# Altium footprint library Connectors.PcbLib: 122 footprints (part 8 of 8)
Each footprint in its own frame and in the unit in brackets; x right, y up, seen from the top. Pads: shape width x height; smd on the part's side, far side on the other; paste and mask are expansions set on the pad; w line width, h text height; cw(c..) or ccw(c..) is an arc to the next point about the centre after c.
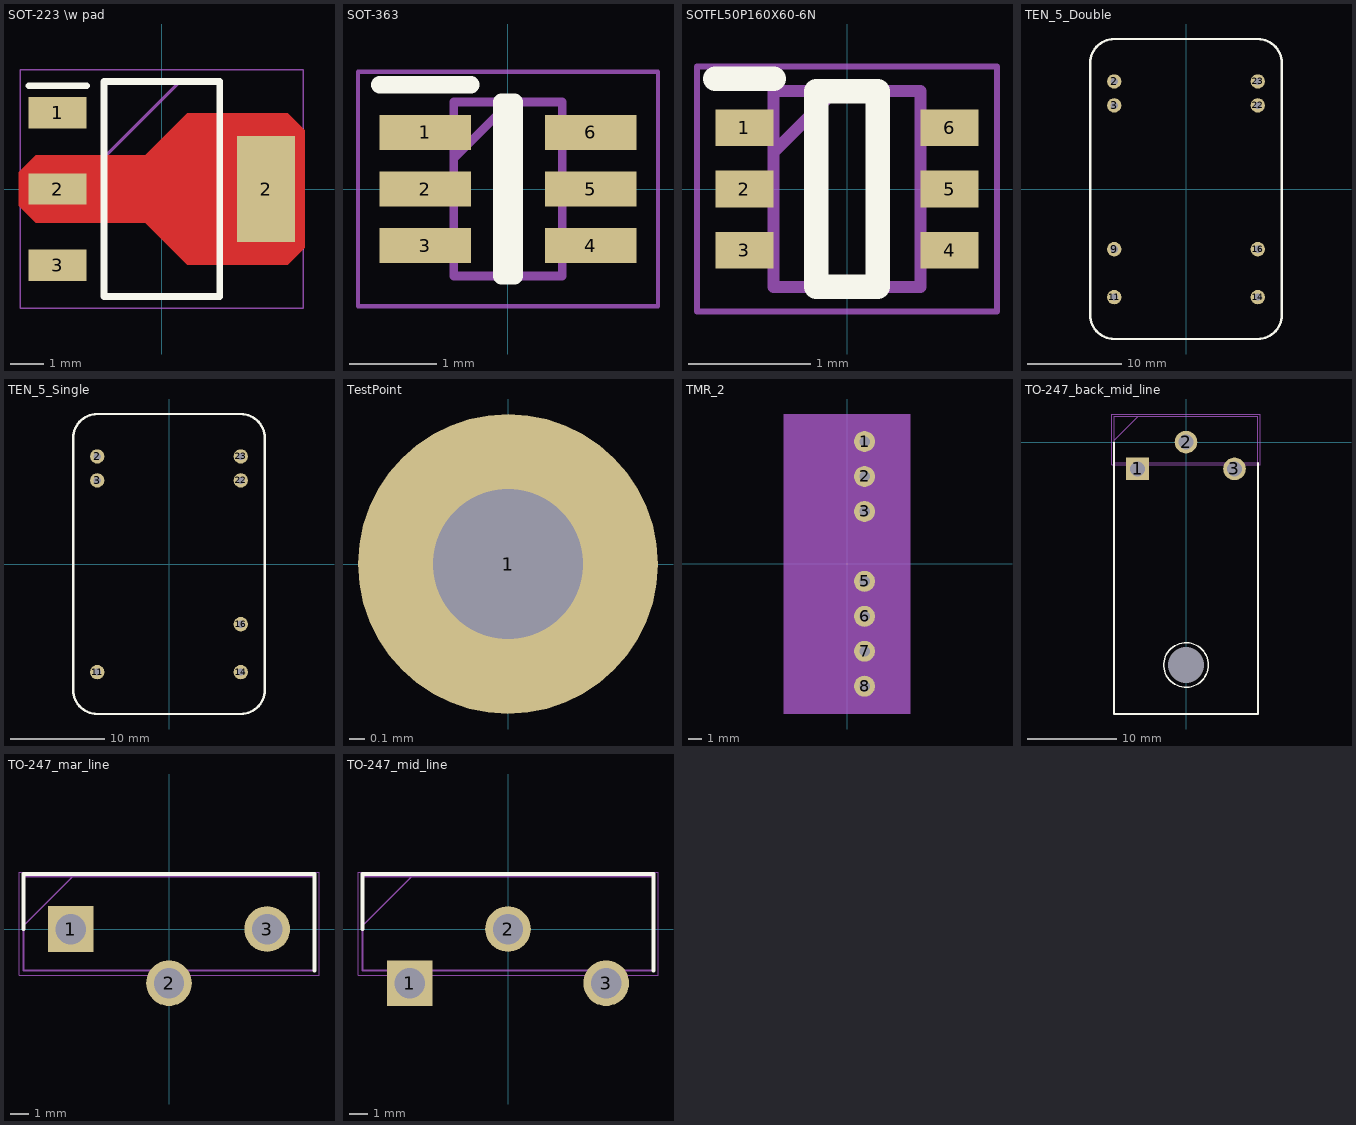
[diagram p7: the footprints below, top view; thin cyan lines are the x and y axes]

## SOT-223 \w pad [mm] "TO-261-AA"
pads (4):
  rect 1.75x0.95 smd: 1(-3.15,2.3) 2(-3.15,0) 3(-3.15,-2.3)
  rect 1.75x3.2 smd: 2(3.15,0)
Top Layer:
  region: -4.318,-0.508 -3.81,-1.016 -0.508,-1.016 0.762,-2.286 3.81,-2.286 4.318,-1.778 4.318,1.778 3.81,2.286 0.762,2.286 -0.508,1.016 -3.81,1.016 -4.318,0.508
Top Overlay:
  lines w0.2: -4.025,3.125 -2.275,3.125 ; -1.75,-3.25 1.75,-3.25 1.75,3.25 -1.75,3.25 -1.75,-3.25
Mechanical 13:
  lines w0.1: -1.75,0.95 0.55,3.25 ; -1.75,-3.25 1.75,-3.25 1.75,3.25 -1.75,3.25 -1.75,-3.25
Mechanical 15:
  lines w0.05: -4.275,-3.6 4.275,-3.6 4.275,3.6 -4.275,3.6 -4.275,-3.6
3D body "LM2937IMP-3.3_NOPB.stp": height 1.8, standoff 0, extent -3.5,-3.25 3.5,3.25

## SOT-363 [mm] "SC?88/SC70?6"
pads (6):
  rect 1.05x0.4 smd: 1(-0.95,0.65) 2(-0.95,0) 3(-0.95,-0.65) 4(0.95,-0.65) 5(0.95,0) 6(0.95,0.65)
Top Overlay:
  lines w0.2: -1.475,1.2 -0.425,1.2 ; -0.075,-1 -0.075,1 0.075,1 0.075,-1 -0.075,-1
Mechanical 13:
  lines w0.1: -0.625,0.35 0.025,1 ; -0.625,-1 -0.625,1 0.625,1 0.625,-1 -0.625,-1
Mechanical 15:
  lines w0.05: -1.725,-1.35 -1.725,1.35 1.725,1.35 1.725,-1.35 -1.725,-1.35
3D body "BC857BDW1T1G.stp": height 1.1, standoff 0, extent -1.05,-1 1.05,1

## SOTFL50P160X60-6N [mm]
pads (6):
  rect 0.475x0.3 smd: 1(-0.838,0.5) 2(-0.838,0) 3(-0.838,-0.5) 4(0.838,-0.5) 5(0.838,0) 6(0.838,0.5)
Top Overlay:
  lines w0.2: -1.075,0.9 -0.6,0.9 ; -0.25,-0.8 -0.25,0.8 0.25,0.8 0.25,-0.8 -0.25,-0.8
Mechanical 13:
  lines w0.1: -0.6,0.3 -0.1,0.8 ; -0.6,-0.8 -0.6,0.8 0.6,0.8 0.6,-0.8 -0.6,-0.8
Mechanical 15:
  lines w0.05: -1.225,-1 -1.225,1 1.225,1 1.225,-1 -1.225,-1
3D body "SN74LVC2G04DRLR.stp": height 0.6, standoff 0, extent -0.8,-0.8 0.8,0.8

## TEN_5_Double [mil] "DC/DC Converters  TEN 5 Series, 6 Watt"
height 401.57
pads (8):
  round 60 hole 30: 2(-299.61,448.82) 3(-299.61,348.82) 9(-299.61,-251.18) 11(-299.61,-451.18) 14(299.61,-451.18) 16(299.61,-251.18) 22(299.61,348.82) 23(299.61,448.82)
Top Overlay:
  lines w10: -399.61,-525.98 ccw(c-299.61,-525.98) -299.61,-625.98 299.61,-625.98 ccw(c299.61,-525.98) 399.61,-525.98 399.61,525.98 ccw(c299.61,525.98) 299.61,625.98 -299.61,625.98 ccw(c-299.61,525.98) -399.61,525.98 -399.61,-525.98
Bottom Overlay:
  text "+Vout" at 250.19,-470.52 h39.37
  text "-Vout" at 250.19,-270.52 h39.37
  text "-Vout" at -73.69,-476.76 h39.37
  text "Common" at -21.21,-276.76 h39.37
  text "-Vin" at -112.39,330.25 h39.37
  text "-Vin" at -112.39,430.25 h39.37
  text "+Vin" at 250.19,329.48 h39.37
  text "+Vin" at 250.19,429.48 h39.37
3D body "Traco_power_TEN5.STEP": height 401.57, standoff -161.42, extent -399.61,-625.98 399.6,625.99

## TEN_5_Single [mil] "DC/DC Converters  TEN 5 Series, 6 Watt"
height 401.57
pads (7):
  round 60 hole 30: 2(-299.61,448.82) 3(-299.61,348.82) 11(-299.61,-451.18) 14(299.61,-451.18) 16(299.61,-251.18) 22(299.61,348.82) 23(299.61,448.82)
Top Overlay:
  lines w10: -399.61,-525.98 ccw(c-299.61,-525.98) -299.61,-625.98 299.61,-625.98 ccw(c299.61,-525.98) 399.61,-525.98 399.61,525.98 ccw(c299.61,525.98) 299.61,625.98 -299.61,625.98 ccw(c-299.61,525.98) -399.61,525.98 -399.61,-525.98
Bottom Overlay:
  text "+Vout" at 250.19,-470.52 h39.37
  text "-Vout" at 250.19,-270.52 h39.37
  text "NC" at -178.64,-476.76 h39.37
  text "-Vin" at -112.39,330.25 h39.37
  text "-Vin" at -112.39,430.25 h39.37
  text "+Vin" at 250.19,329.48 h39.37
  text "+Vin" at 250.19,429.48 h39.37
3D body "Traco_power_TEN5.STEP": height 401.57, standoff 39.37, extent -399.61,-625.98 399.6,625.99

## TestPoint [mm]
pads (1):
  round 2 hole 1: 1(0,0)
3D body "TestPoint.STEP": height 4.2, standoff -5.11, extent -0.5,-1.2 0.5,1.2

## TMR_2 [mil] "DC/DC Converters  TMR 2 Series, 2 Watt"
height 437.01
pads (7):
  round 60 hole 30: 1(50.2,350.39) 2(50.2,250.39) 3(50.2,150.39) 5(50.2,-49.61) 6(50.2,-149.61) 7(50.2,-249.61) 8(50.2,-349.61)
Mechanical 1:
  rectangle: -181.11,-429.14 181.1,429.13
3D body "Traco_power_TMR2.step": height 440.94, standoff -161.42, extent -179.14,-429.14 179.13,429.13

## TO-247_back_mid_line [mm]
height 21
pads (4):
  rect 2.535x2.535 hole 1.69: 1(-5.44,-3)
  round 2.535 hole 1.69: 2(0,0) 3(5.44,-3)
  round 0 hole 4 unplated: 19(0,-25)
Top Overlay:
  circle w0.15: c0,-25 r2.5
  lines w0.2: -8.065,0 -8.065,-30.5 8.065,-30.5 8.065,-2.3
Bottom Overlay:
  circle w0.15: c0,-25 r2.5
Drill Guide:
  circle w0.01: c0,-25 r2.5
Mechanical 13:
  lines w0.1: -8.065,0.19 -5.345,2.91 ; -8.065,-2.3 8.065,-2.3 8.065,2.91 -8.065,2.91 -8.065,-2.3
Mechanical 15:
  lines w0.05: -8.315,-2.55 -8.315,3.16 8.315,3.16 8.315,-2.55 -8.315,-2.55
3D body "TO-247_horizontal_back_triangle_mid.stp": height 3.15, standoff -5.45, extent -7.8,-30.3 7.8,0.3

## TO-247_mar_line [mm]
height 21
pads (3):
  rect 2.535x2.535 hole 1.69: 1(-5.44,0)
  round 2.535 hole 1.69: 2(0,-3) 3(5.44,0)
Top Overlay:
  lines w0.2: -8.065,0 -8.065,3.05 8.065,3.05 8.065,-2.3
Mechanical 13:
  lines w0.1: -8.065,0.19 -5.345,2.91 ; -8.065,-2.3 8.065,-2.3 8.065,2.91 -8.065,2.91 -8.065,-2.3
Mechanical 15:
  lines w0.05: -8.315,-2.55 -8.315,3.16 8.315,3.16 8.315,-2.55 -8.315,-2.55
3D body "TO-247_vertical_triangle_mid.stp": height 31.3, standoff -2, extent -7.8,-3.05 7.8,3.05

## TO-247_mid_line [mm]
height 21
pads (3):
  rect 2.535x2.535 hole 1.69: 1(-5.44,-3)
  round 2.535 hole 1.69: 2(0,0) 3(5.44,-3)
Top Overlay:
  lines w0.2: -8.065,0 -8.065,3.05 8.065,3.05 8.065,-2.3
Mechanical 13:
  lines w0.1: -8.065,0.19 -5.345,2.91 ; -8.065,-2.3 8.065,-2.3 8.065,2.91 -8.065,2.91 -8.065,-2.3
Mechanical 15:
  lines w0.05: -8.315,-2.55 -8.315,3.16 8.315,3.16 8.315,-2.55 -8.315,-2.55
3D body "TO-247_vertical_triangle_margin.stp": height 31.3, standoff -2, extent -7.8,-3.05 7.8,3.05